# Altium footprint library Wurth_Elektronik_Electromechanic_Wire_to_Board_Connectors_rev16a.PCBLIB: 662 footprints (part 26 of 42)
Each footprint in its own frame and in the unit in brackets; x right, y up, seen from the top. Pads: shape width x height; smd on the part's side, far side on the other; paste and mask are expansions set on the pad; w line width, h text height; cw(c..) or ccw(c..) is an arc to the next point about the centre after c.
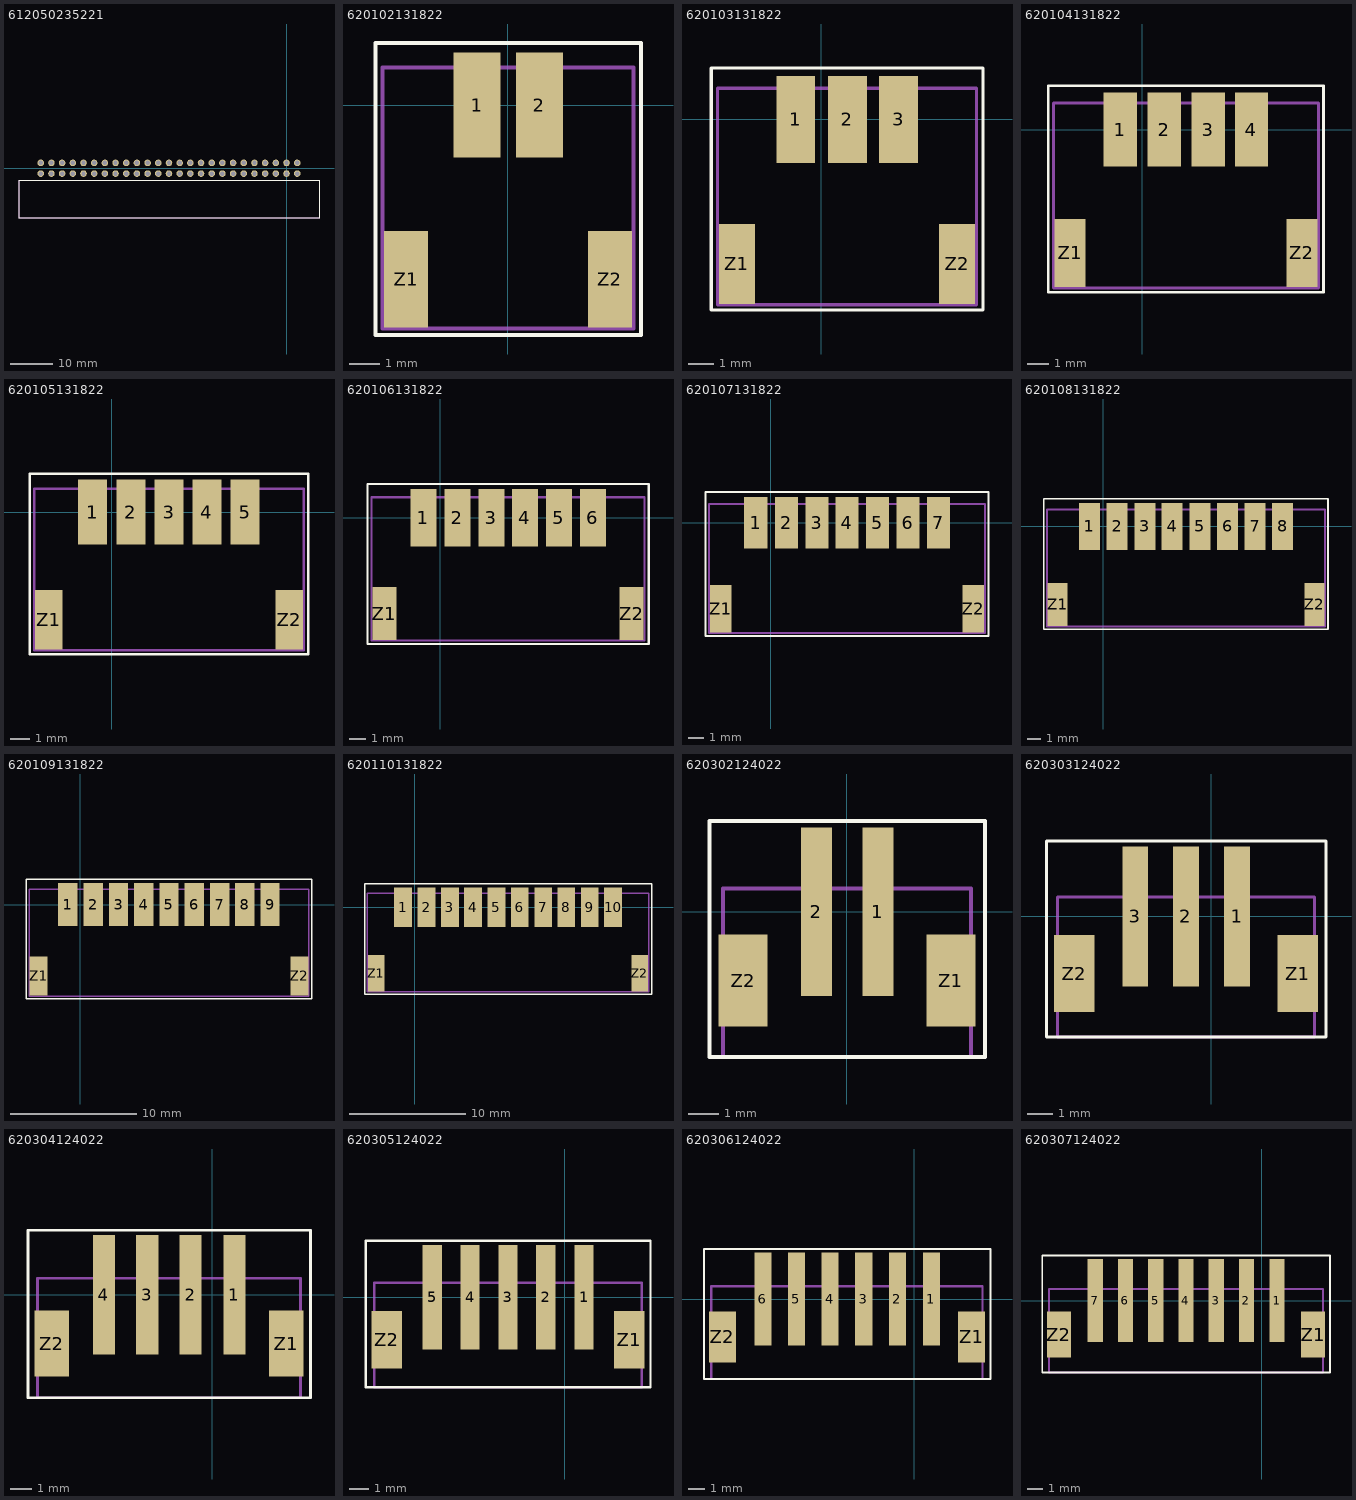
[diagram p25: the footprints below, top view; thin cyan lines are the x and y axes]

## 612050235221 [mil]
pads (50):
  round 61.5 hole 41: 1(-2300,50) 2(-2300,-50) 3(-2200,50) 4(-2200,-50) 5(-2100,50) 6(-2100,-50) 7(-2000,50) 8(-2000,-50) 9(-1900,50) 10(-1900,-50) 11(-1800,50) 12(-1800,-50) 13(-1700,50) 14(-1700,-50) 15(-1600,50) 16(-1600,-50) 17(-1500,50) 18(-1500,-50) 19(-1400,50) 20(-1400,-50) 21(-1300,50) 22(-1300,-50) 23(-1200,50) 24(-1200,-50) 25(-1100,50) 26(-1100,-50) 27(-1000,50) 28(-1000,-50) 29(-900,50) 30(-900,-50) 31(-800,50) 32(-800,-50) 33(-700,50) 34(-700,-50) 35(-600,50) 36(-600,-50) 37(-500,50) 38(-500,-50) 39(-400,50) 40(-400,-50) 41(-300,50) 42(-300,-50) 43(-200,50) 44(-200,-50) 45(-100,50) 46(-100,-50) 47(0,50) 48(0,-50) 49(100,50) 50(100,-50)
Top Overlay:
  lines w5: -2503.54,-469.29 304,-469.29 304,-112.99 -2503.54,-112.99 -2503.54,-469.29
Mechanical 2:
  text ">NAME" at 360,-254.74 h77.5
Mechanical 4:
  text ">VALUE" at 360,-347.69 h77.5
Mechanical 16:
  lines w5: -2503.54,-469.29 304,-469.29 304,-112.99 -2503.54,-112.99 -2503.54,-469.29
  text "1" at -2325,25 h77.5
  text "50" at 75,-75 h77.5

## 620102131822 [mil]
pads (4):
  rect 60x134 smd: 1(-39.37,0) 2(40,0)
  rect 56x123 smd: Z1(-129.92,-222.44) Z2(130,-222.44)
Top Overlay:
  lines w5: -169.29,-293.31 170,-293.31 170,79 -169.29,79 -169.29,-293.31
Mechanical 2:
  text ">NAME" at -125,100 h77.5
Mechanical 4:
  text ">VALUE" at -125,-369.49 h77.5
Mechanical 16:
  lines w5: -159.94,-285.43 160,-285.43 160,48 -159.94,48 -159.94,-285.43
  text "1" at -50,-25 h77.5

## 620103131822 [mil]
pads (5):
  rect 60x134 smd: 1(-39.37,0) 2(40,0) 3(119,0)
  rect 56x123 smd: Z1(-129.92,-222.44) Z2(209,-222.44)
Top Overlay:
  lines w5: -169.29,-293.31 249,-293.31 249,79 -169.29,79 -169.29,-293.31
Mechanical 2:
  text ">NAME" at -75,100 h77.5
Mechanical 4:
  text ">VALUE" at -75,-369.49 h77.5
Mechanical 16:
  lines w5: -159.94,-285.43 239,-285.43 239,48 -159.94,48 -159.94,-285.43
  text "1" at -75,-25 h77.5

## 620104131822 [mil]
pads (6):
  rect 60x134 smd: 1(-39.37,0) 2(40,0) 3(119,0) 4(197,0)
  rect 56x123 smd: Z1(-129.92,-222.44) Z2(288,-222.44)
Top Overlay:
  lines w5: -169.29,-293.31 327,-293.31 327,79 -169.29,79 -169.29,-293.31
Mechanical 2:
  text ">NAME" at -25,100 h77.5
Mechanical 4:
  text ">VALUE" at -50,-369.49 h77.5
Mechanical 16:
  lines w5: -159.94,-285.43 318,-285.43 318,48 -159.94,48 -159.94,-285.43
  text "1" at -75,-25 h77.5

## 620105131822 [mil]
pads (7):
  rect 60x134 smd: 1(-39.37,0) 2(40,0) 3(119,0) 4(197,0) 5(276,0)
  rect 56x123 smd: Z1(-129.92,-222.44) Z2(367,-222.44)
Top Overlay:
  lines w5: -169.29,-293.31 406,-293.31 406,79 -169.29,79 -169.29,-293.31
Mechanical 2:
  text ">NAME" at 0,100 h77.5
Mechanical 4:
  text ">VALUE" at 0,-369.49 h77.5
Mechanical 16:
  lines w5: -159.94,-285.43 397,-285.43 397,48 -159.94,48 -159.94,-285.43
  text "1" at -75,-25 h77.5

## 620106131822 [mil]
pads (8):
  rect 60x134 smd: 1(-39.37,0) 2(40,0) 3(119,0) 4(197,0) 5(276,0) 6(355,0)
  rect 56x123 smd: Z1(-129.92,-222.44) Z2(445,-222.44)
Top Overlay:
  lines w5: -169.29,-293.31 485,-293.31 485,79 -169.29,79 -169.29,-293.31
Mechanical 2:
  text ">NAME" at 25,100 h77.5
Mechanical 4:
  text ">VALUE" at 25,-369.49 h77.5
Mechanical 16:
  lines w5: -159.94,-285.43 475,-285.43 475,48 -159.94,48 -159.94,-285.43
  text "1" at -75,-25 h77.5

## 620107131822 [mil]
pads (9):
  rect 60x134 smd: 1(-39.37,0) 2(40,0) 3(119,0) 4(197,0) 5(276,0) 6(355,0) 7(434,0)
  rect 56x123 smd: Z1(-129.92,-222.44) Z2(524,-222.44)
Top Overlay:
  lines w5: -169.29,-293.31 563,-293.31 563,79 -169.29,79 -169.29,-293.31
Mechanical 2:
  text ">NAME" at 75,100 h77.5
Mechanical 4:
  text ">VALUE" at 50,-369.49 h77.5
Mechanical 16:
  lines w5: -159.94,-285.43 554,-285.43 554,48 -159.94,48 -159.94,-285.43
  text "1" at -75,-25 h77.5

## 620108131822 [mil]
pads (10):
  rect 60x134 smd: 1(-39.37,0) 2(40,0) 3(119,0) 4(197,0) 5(276,0) 6(355,0) 7(434,0) 8(512,0)
  rect 56x123 smd: Z1(-129.92,-222.44) Z2(603,-222.44)
Top Overlay:
  lines w5: -169.29,-293.31 642,-293.31 642,79 -169.29,79 -169.29,-293.31
Mechanical 2:
  text ">NAME" at 125,100 h77.5
Mechanical 4:
  text ">VALUE" at 100,-369.49 h77.5
Mechanical 16:
  lines w5: -159.94,-285.43 633,-285.43 633,48 -159.94,48 -159.94,-285.43
  text "1" at -75,-25 h77.5

## 620109131822 [mil]
pads (11):
  rect 60x134 smd: 1(-39.37,0) 2(40,0) 3(119,0) 4(197,0) 5(276,0) 6(355,0) 7(434,0) 8(512,0) 9(591,0)
  rect 56x123 smd: Z1(-129.92,-222.44) Z2(682,-222.44)
Top Overlay:
  lines w5: -169.29,-293.31 721,-293.31 721,79 -169.29,79 -169.29,-293.31
Mechanical 2:
  text ">NAME" at 150,100 h77.5
Mechanical 4:
  text ">VALUE" at 125,-369.49 h77.5
Mechanical 16:
  lines w5: -159.94,-285.43 712,-285.43 712,48 -159.94,48 -159.94,-285.43
  text "1" at -75,-25 h77.5

## 620110131822 [mil]
pads (12):
  rect 60x134 smd: 1(-39.37,0) 2(40,0) 3(119,0) 4(197,0) 5(276,0) 6(355,0) 7(434,0) 8(512,0) 9(591,0) 10(670,0)
  rect 56x123 smd: Z1(-129.92,-222.44) Z2(760,-222.44)
Top Overlay:
  lines w5: -169.29,-293.31 800,-293.31 800,79 -169.29,79 -169.29,-293.31
Mechanical 2:
  text ">NAME" at 200,100 h77.5
Mechanical 4:
  text ">VALUE" at 200,-369.49 h77.5
Mechanical 16:
  lines w5: -159.94,-285.43 790,-285.43 790,48 -159.94,48 -159.94,-285.43
  text "1" at -75,-25 h77.5

## 620302124022 [mil]
pads (4):
  rect 40x217 smd: 1(40,0) 2(-39.37,0)
  rect 63x119 smd: Z1(134,-88.58) Z2(-133.86,-88.58)
Top Overlay:
  lines w5: -177.17,-187.01 178,-187.01 178,117 -177.17,117 -177.17,-187.01
Mechanical 2:
  text ">NAME" at -125,150 h77.5
Mechanical 4:
  text ">VALUE" at -125,-275 h77.5
Mechanical 16:
  lines w5: -159.94,-187.01 160,-187.01 160,30 -159.94,30 -159.94,-187.01
  text "1" at 25,-50 h77.5

## 620303124022 [mil]
pads (5):
  rect 40x217 smd: 1(40,0) 2(-39.37,0) 3(-118.11,0)
  rect 63x119 smd: Z1(134,-88.58) Z2(-212.6,-88.58)
Top Overlay:
  lines w5: -255.91,-187.01 178,-187.01 178,117 -255.91,117 -255.91,-187.01
Mechanical 2:
  text ">NAME" at -150,150 h77.5
Mechanical 4:
  text ">VALUE" at -150,-275 h77.5
Mechanical 16:
  lines w5: -238.68,-187.01 160,-187.01 160,30 -238.68,30 -238.68,-187.01
  text "1" at 25,-50 h77.5

## 620304124022 [mil]
pads (6):
  rect 40x217 smd: 1(40,0) 2(-39.37,0) 3(-118.11,0) 4(-196.85,0)
  rect 63x119 smd: Z1(134,-88.58) Z2(-291.34,-88.58)
Top Overlay:
  lines w5: -334.65,-187.01 178,-187.01 178,117 -334.65,117 -334.65,-187.01
Mechanical 2:
  text ">NAME" at -200,150 h77.5
Mechanical 4:
  text ">VALUE" at -225,-250 h77.5
Mechanical 16:
  lines w5: -317.42,-187.01 160,-187.01 160,30 -317.42,30 -317.42,-187.01
  text "1" at 25,-50 h77.5

## 620305124022 [mil]
pads (7):
  rect 40x217 smd: 1(40,0) 2(-39.37,0) 3(-118.11,0) 4(-196.85,0) 5(-275.59,0)
  rect 63x119 smd: Z1(134,-88.58) Z2(-370.08,-88.58)
Top Overlay:
  lines w5: -413.39,-187.01 178,-187.01 178,117 -413.39,117 -413.39,-187.01
Mechanical 2:
  text ">NAME" at -250,150 h77.5
Mechanical 4:
  text ">VALUE" at -225,-250 h77.5
Mechanical 16:
  lines w5: -396.16,-187.01 160,-187.01 160,30 -396.16,30 -396.16,-187.01
  text "1" at 25,-50 h77.5

## 620306124022 [mil]
pads (8):
  rect 40x217 smd: 1(40,0) 2(-39.37,0) 3(-118.11,0) 4(-196.85,0) 5(-275.59,0) 6(-354.33,0)
  rect 63x119 smd: Z1(134,-88.58) Z2(-448.82,-88.58)
Top Overlay:
  lines w5: -492.13,-187.01 178,-187.01 178,117 -492.13,117 -492.13,-187.01
Mechanical 2:
  text ">NAME" at -275,150 h77.5
Mechanical 4:
  text ">VALUE" at -275,-275 h77.5
Mechanical 16:
  lines w5: -474.9,-187.01 160,-187.01 160,30 -474.9,30 -474.9,-187.01
  text "1" at 25,-50 h77.5

## 620307124022 [mil]
pads (9):
  rect 40x217 smd: 1(40,0) 2(-39.37,0) 3(-118.11,0) 4(-196.85,0) 5(-275.59,0) 6(-354.33,0) 7(-433.07,0)
  rect 63x119 smd: Z1(134,-88.58) Z2(-527.56,-88.58)
Top Overlay:
  lines w5: -570.87,-187.01 178,-187.01 178,117 -570.87,117 -570.87,-187.01
Mechanical 2:
  text ">NAME" at -325,150 h77.5
Mechanical 4:
  text ">VALUE" at -325,-275 h77.5
Mechanical 16:
  lines w5: -553.64,-187.01 160,-187.01 160,30 -553.64,30 -553.64,-187.01
  text "1" at 25,-50 h77.5